# Altium footprint library Connectors_Old.PcbLib: 246 footprints (part 18 of 18)
Each footprint in its own frame and in the unit in brackets; x right, y up, seen from the top. Pads: shape width x height; smd on the part's side, far side on the other; paste and mask are expansions set on the pad; w line width, h text height; cw(c..) or ccw(c..) is an arc to the next point about the centre after c.
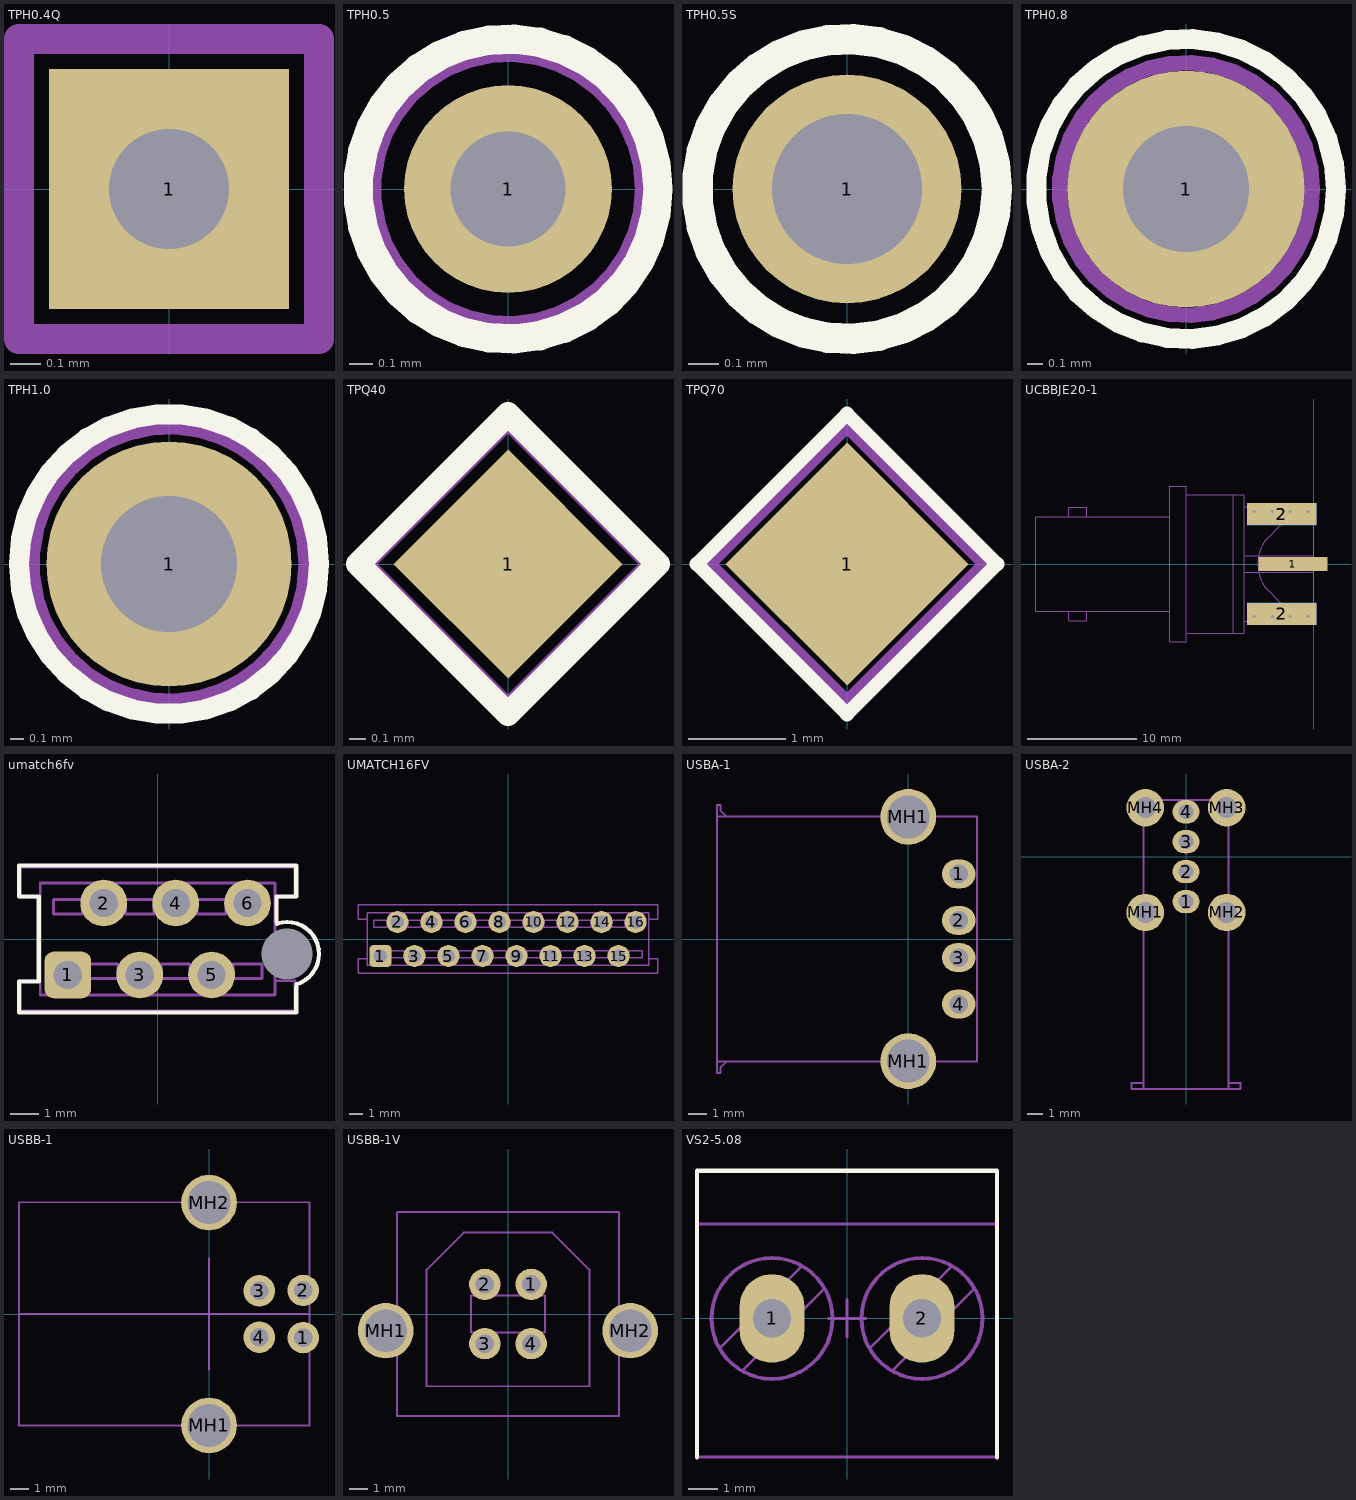
[diagram p17: the footprints below, top view; thin cyan lines are the x and y axes]

## TPH0.4Q [mm] "Test point TH 0.4mm + Square pad TB"
pads (1):
  rect 0.8x0.8 / inner round 0.8 / far side rect 0.8x0.8 hole 0.4: 1(0,0)
Mechanical 13:
  lines w0.1: -0.5,-0.5 -0.5,0.5 0.5,0.5 0.5,-0.5 -0.5,-0.5

## TPH0.5 [mm] "Test point TH 0.5mm"
pads (1):
  round 0.9 hole 0.5: 1(0,0)
Top Overlay:
  circle w0.127: c0,0 r0.65
Mechanical 13:
  circle w0.1: c0,0 r0.6

## TPH0.5S [mil] "Test point TH 0.5mm slim"
pads (1):
  round 30 hole 19.68: 1(0,0)
Top Overlay:
  circle w4: c0,0 r19.68
Mechanical 13:
  circle w3.94: c0,0 r11.81

## TPH0.8 [mm] "Test point TH 0.8mm"
pads (1):
  round 1.5 hole 0.8: 1(0,0)
Top Overlay:
  circle w0.127: c0,0 r0.95
Mechanical 13:
  circle w0.1: c0,0 r0.8

## TPH1.0 [mm]
pads (1):
  round 1.8 hole 1: 1(0,0)
Top Overlay:
  circle w0.15: c0,0 r1.1
Mechanical 13:
  circle w0.1: c0,0 r1

## TPQ40 [mil] "Touch point diamond bottom 40MIL"
pads (1):
  rect 40x40 smd rot 45 paste-90: 1(0,0)
Top Overlay:
  lines w5.91: -37,0 0,37 37,0 0,-37 -37,0
Mechanical 13:
  lines w4.02: -35,0 0,-35 35,0 0,35 -35,0
Mechanical 15:
  lines w4.02: -25,0 25,0 ; 0,-25 0,25

## TPQ70 [mil] "Touch point diamond bottom"
pads (1):
  rect 70x70 smd rot 45 paste-90: 1(0,0)
Top Overlay:
  lines w5.91: -61,0 0,-61 61,0 0,61 -61,0
Mechanical 13:
  lines w4.02: -55,0 0,55 55,0 0,-55 -55,0

## UCBBJE20-1 [mil] "Circuit Board Bulkhead Edge Mount  Coax “BNC” Style Receptacle"
height 430
pads (5):
  rect 250x50 smd: 1(-75,0)
  rect 250x80 smd: 2(-115,-180) 2(-115,180)
  rect 250x80 smd far side: 2(-115,-180) 2(-115,180)
via -150,-190 diameter 23.62 hole 11.81
via -20,-190 diameter 23.62 hole 11.81
via -85,-190 diameter 23.62 hole 11.81
via -215,-190 diameter 23.62 hole 11.81
via -215,190 diameter 23.62 hole 11.81
via -85,190 diameter 23.62 hole 11.81
via -20,190 diameter 23.62 hole 11.81
via -150,190 diameter 23.62 hole 11.81
Mechanical 13:
  lines w4: -885,-170 -885,-205 -820,-205 -820,-170 ; -885,170 -885,205 -820,205 -820,170 ; -520,-170 -1003,-170 -1003,170 -520,170 ; -460,-250 -290,-250 ; -460,250 -290,250 ; 0,-170 -40,-170 cw(c-40,-49.29) -125.36,-134.64 -164.64,-95.36 cw(c-79.29,-10) -200,-10 -200,-5 ; 0,170 -40,170 ccw(c-40,49.29) -125.36,134.64 -164.64,95.36 ccw(c-79.29,10) -200,10 -200,5 ; -290,-250 -250,-250 -250,-206 ; -290,-250 -290,250 ; -290,250 -250,250 -250,206 ; -250,-206 0,-206 0,206 -250,206 ; -250,-206 -250,206 ; -200,-5 -200,0 ; -200,-5 -200,0 ; -200,0 -200,5 ; -200,0 -200,5 ; -520,-281 -460,-281 -460,281 -520,281 -520,-281
Mechanical 14:
  lines w4: -520,-170 -1003,-170 -1003,170 -520,170 ; -460,-250 -290,-250 ; -460,250 -290,250 ; -250,-30 0,-30 ; -250,30 0,30 ; -290,-250 -250,-250 -250,-206 ; -290,-250 -290,250 ; -290,250 -250,250 -250,206 ; -250,-206 0,-206 0,206 -250,206 ; -250,-206 -250,206 ; -520,-281 -460,-281 -460,281 -520,281 -520,-281
Mechanical 15:
  lines w4: -200,-170 -60,-170 ; -200,170 -60,170
3D body: height 215, standoff 190, extent -250,-206 0,206
3D body: height -90, standoff -190, extent -250,-206 0,-170
3D body: height 190, standoff 0, extent -250,170 0,206
3D body: height -190, standoff -215, extent -250,-206 0,-30
3D body: height -190, standoff -215, extent -250,30 0,206
3D body: height 190, standoff 0, extent -250,-206 0,-170
3D body: height -90, standoff -190, extent -250,170 0,206
3D body: height 51, standoff 21, extent -250,-25 0,25
3D body: height 248.03, standoff -250, extent -290,-249.51 -250,249.51
3D body: height 248.03, standoff -250, extent -460,-250 -290,249.01
3D body: height 278.78, standoff -281, extent -520,-281 -460,279.89
3D body: height 20, standoff 0, extent -885,-205 -820,-170
3D body: height 20, standoff 0, extent -885,170 -820,205
3D body: height 168.66, standoff -170, extent -1003,-170 -520,169.33

## umatch6fv [mil] "AMP u Match 6pin vertical female"
height 118.11
pads (7):
  round 0 hole 70.87 unplated paste-90 mask+43: 0(180.12,-20.87)
  rrect40% 65x65 hole 39.37: 1(-125,-50)
  round 65 hole 39.37: 2(-75,50) 3(-25,-50) 4(25,50) 5(75,-50) 6(125,50)
Top Overlay:
  lines w5.91: 165.35,23.62 165.35,59.06 192.91,59.06 192.91,102.36 -192.91,102.36 -192.91,59.06 -165.35,59.06 -165.35,-59.06 -192.91,-59.06 -192.91,-102.36 192.91,-102.36 192.91,-66.93 ; 166.11,21.35 cw(c180.12,-20.67) 193.21,-62.98
Mechanical 13:
  lines w4: -163.39,-58.07 -190.94,-58.07 -190.94,-100 190.94,-100 190.94,-58.07 163.39,-58.07 ; -163.39,58.07 -190.94,58.07 -190.94,100 190.94,100 190.94,58.07 163.39,58.07 ; -163.39,-77.76 -163.39,77.76 163.39,77.76 163.39,-77.76 -163.39,-77.76 ; -145,35 -145,55 -105,55 -105,35 -145,35 ; -95,-55 -55,-55 -55,-35 -95,-35 -95,-55 ; -45,35 -5,35 -5,55 -45,55 -45,35 ; 5,-55 45,-55 45,-35 5,-35 5,-55 ; 55,35 95,35 95,55 55,55 55,35 ; 105,-55 145,-55 145,-35 105,-35 105,-55

## UMATCH16FV [mil] "AMP u Match 16pin vertical female"
height 118.11
pads (16):
  rrect40% 65x65 hole 39.37: 1(-375,-50)
  round 65 hole 39.37: 2(-325,50) 3(-275,-50) 4(-225,50) 5(-175,-50) 6(-125,50) 7(-75,-50) 8(-25,50) 9(25,-50) 10(75,50) 11(125,-50) 12(175,50) 13(225,-50) 14(275,50) 15(325,-50) 16(375,50)
Mechanical 13:
  lines w4: -413.39,-58.07 -440.94,-58.07 -440.94,-100 440.94,-100 440.94,-58.07 413.39,-58.07 ; -413.39,58.07 -440.94,58.07 -440.94,100 440.94,100 440.94,58.07 413.39,58.07 ; -413.39,-77.76 413.39,-77.76 413.39,77.76 -413.39,77.76 -413.39,-77.76 ; -395,35 -355,35 -355,55 -395,55 -395,35 ; -345,-55 -345,-35 -305,-35 -305,-55 -345,-55 ; -295,35 -295,55 -255,55 -255,35 -295,35 ; -245,-55 -245,-35 -205,-35 -205,-55 -245,-55 ; -195,35 -195,55 -155,55 -155,35 -195,35 ; -145,-55 -145,-35 -105,-35 -105,-55 -145,-55 ; -95,35 -55,35 -55,55 -95,55 -95,35 ; -45,-55 -5,-55 -5,-35 -45,-35 -45,-55 ; 5,35 45,35 45,55 5,55 5,35 ; 55,-55 95,-55 95,-35 55,-35 55,-55 ; 105,35 145,35 145,55 105,55 105,35 ; 155,-55 195,-55 195,-35 155,-35 155,-55 ; 205,35 245,35 245,55 205,55 205,35 ; 255,-55 295,-55 295,-35 255,-35 255,-55 ; 305,35 345,35 345,55 305,55 305,35 ; 355,-55 395,-55 395,-35 355,-35 355,-55
3D body: height 157.48, standoff 0, extent -413.39,-77.76 413.39,77.76
3D body: height 59.06, standoff 0, extent -440.94,-100 440.94,-58.07
3D body: height 59.06, standoff 0, extent -440.94,58.07 440.94,100

## USBA-1 [mm] "USB/A PCB horiz. connector"
height 7.2
pads (6):
  oval 1.8x1.55 hole 1: 1(2.71,3.5) 2(2.71,1) 3(2.71,-1) 4(2.71,-3.5)
  round 3 hole 2.3: MH1(0,-6.57) MH1(0,6.57)
Mechanical 13:
  lines w0.102: -9.8,-6.6 -10.1,-6.9 -10.1,-7.2 -10.3,-7.2 -10.3,-6.6 ; -9.8,6.6 -10.1,6.9 -10.1,7.2 -10.3,7.2 -10.3,6.6 ; -10.3,-6.6 -10.3,6.6 ; -10.3,-6.6 3.7,-6.6 3.7,6.6 -10.3,6.6

## USBA-2 [mm] "USB/A PCB vert/horiz. connector"
height 14
pads (8):
  oval 1.8x1.55 hole 1: 1(0,-3) 2(0,-1) 3(0,1) 4(0,3)
  round 2.5 hole 1.4: MH1(-2.72,-3.73) MH2(2.72,-3.73) MH3(2.72,3.27) MH4(-2.72,3.27)
Mechanical 13:
  lines w0.127: -2.85,-15.125 -3.65,-15.125 -3.65,-15.525 -2.85,-15.525 ; 2.85,-15.125 3.65,-15.125 3.65,-15.525 2.85,-15.525 ; -2.85,-15.525 2.85,-15.525 ; -2.85,-15.525 -2.85,3.775 2.85,3.775 2.85,-15.525
3D body: height 4.1, standoff 3, extent -0.1,-15 0.1,-4.8
3D body: height 10.8, standoff 9.7, extent -0.1,-15 0.1,-4.8
3D body: height 8.5, standoff 7.4, extent -0.1,-15 0.1,-4.8
3D body: height 6.4, standoff 5.3, extent -0.1,-15 0.1,-4.8
3D body: height 12.75, standoff 1.1, extent -3.65,-15.525 3.65,3.775
3D body: height 13.85, standoff 13.05, extent -3.65,-15.525 3.65,-15.125
3D body: height 11.7, standoff 2.1, extent -1.5,-15.3 -0.1,-4.8
3D body: height 13.05, standoff 12.75, extent -3.65,-15.525 3.65,3.775
3D body: height 1.1, standoff 0, extent -3.65,-15.525 3.65,3.775

## USBB-1 [mm] "USB/B PCB horiz. connector"
height 11.02
pads (6):
  round 1.7 hole 1: 1(5.08,-1.27) 2(5.08,1.27) 3(2.71,1.25) 4(2.71,-1.25)
  round 3 hole 2.3: MH1(0,-6.01) MH2(0,6.01)
Mechanical 13:
  lines w0.102: -10.25,-6.015 5.415,-6.015 5.425,-6.005 5.425,6.025 -10.25,6.025 -10.25,-6.015
Mechanical 15:
  lines w0.102: -10.25,0 5.425,0 ; 0,-3 0,3
3D body: height 11, standoff -3.72, extent -10.25,-7.45 6.05,7.45

## USBB-1V [mm] "USB/B PCB vert. connector"
height 15.02
pads (6):
  round 1.7 hole 1: 1(1.25,1.6) 2(-1.25,1.6) 3(-1.25,-1.6) 4(1.25,-1.6)
  round 3 hole 2.3: MH1(-6.6,-0.9) MH2(6.6,-0.9)
Mechanical 13:
  lines w0.102: -6,-5.5 -6,5.5 6,5.5 6,-5.5 -6,-5.5 ; -4.4,-3.9 -4.4,2.4 -2.4,4.4 2.4,4.4 4.4,2.4 4.4,-3.9 -4.4,-3.9 ; -2,-1 2,-1 2,1 -2,1 -2,-1
3D body: height 15, standoff 0, extent -6,-5.5 6,5.5

## VS2-5.08 [mm] "VRSTNA SPONKA 5.08mm"
height 13.8
pads (2):
  oval 2.2x3 hole 1.3: 1(-2.54,0) 2(2.54,0)
Top Overlay:
  lines w0.15: -5.08,-4.7 -5.08,5 5.08,5 5.08,-4.7
Mechanical 13:
  circle w0.127: c-2.54,0 r2.048
  circle w0.127: c2.54,0 r2.048
  lines w0.102: -5.08,3.2 5.08,3.2 ; -4.318,-1.016 -1.524,1.778 ; -3.556,-1.778 -0.762,1.016 ; 0.762,-1.016 3.556,1.778 ; 1.524,-1.778 4.318,1.016 ; -5.08,-4.7 -5.08,5 5.08,5 5.08,-4.7 -5.08,-4.7
Mechanical 15:
  lines w0.102: -0.635,0 0.635,0 ; 0,-0.635 0,0.635
3D body: height 9, standoff 0, extent -5.08,3.2 5.08,5
3D body: height 13.8, standoff 0, extent -5.08,-4.7 5.08,3.2